# Altium footprint library Components.PcbLib: 139 footprints (part 9 of 9)
Each footprint in its own frame and in the unit in brackets; x right, y up, seen from the top. Pads: shape width x height; smd on the part's side, far side on the other; paste and mask are expansions set on the pad; w line width, h text height; cw(c..) or ccw(c..) is an arc to the next point about the centre after c.
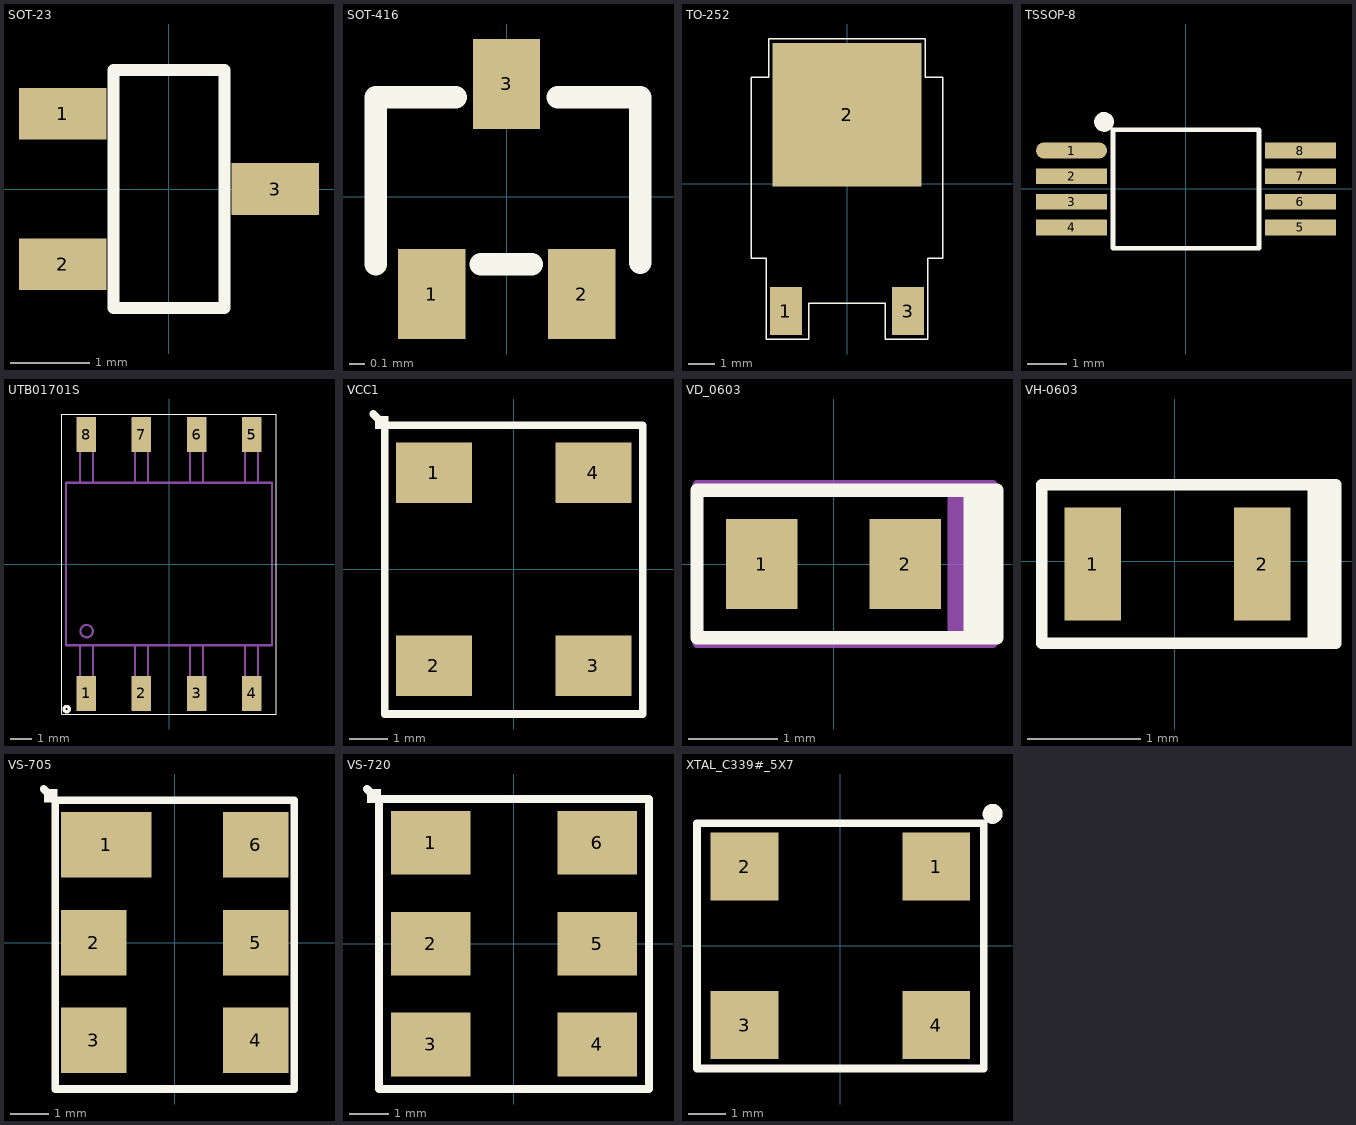
[diagram p8: the footprints below, top view; thin cyan lines are the x and y axes]

## SOT-23 [mm]
pads (3):
  rect 1.1x0.65 smd paste-0.05 mask+0.06: 1(-1.34,0.95) 2(-1.34,-0.95) 3(1.34,0)
Top Overlay:
  lines w0.15: -0.7,-1.5 -0.7,1.5 0.7,1.5 0.7,-1.5 -0.7,-1.5
3D body "SW3dPS-3-lead sot23-3.STEP": height 1.05, standoff 0.03, extent -1.276,-1.46 1.2,1.46

## SOT-416 [mm]
pads (3):
  rect 0.45x0.6 smd paste-0.04 mask+0.04: 1(-0.5,-0.65) 2(0.5,-0.65) 3(0,0.75)
Top Overlay:
  lines w0.15: -0.87,-0.45 -0.87,0.66 -0.34,0.66 ; -0.17,-0.45 0.17,-0.45 ; 0.34,0.66 0.89,0.66 0.89,-0.44
3D body "User Library-SOT-416.step": height 0.78, standoff -0.02, extent -0.79,-0.74 0.81,0.86

## TO-252 [mm]
pads (3):
  rect 1.2x1.8 smd paste-0.18 mask+0.05: 1(-2.3,-4.8) 3(2.3,-4.8)
  rect 5.6x5.4 smd paste-1 mask+0.1: 2(0,2.6)
Top Overlay:
  lines w0.05: -3.6,-2.8 -3.6,4 -2.95,4 -2.95,5.45 2.95,5.45 2.95,4 3.6,4 3.6,-2.8 3.05,-2.8 3.05,-5.85 1.45,-5.85 1.45,-4.5 -1.45,-4.5 -1.45,-5.85 -3.05,-5.85 -3.05,-2.8 -3.6,-2.8
3D body "User Library-DPAK-1.step": height 2.34, standoff -0.07, extent -3.24,-4.969 3.3,4.969

## TSSOP-8 [mm]
pads (8):
  oval 1.8x0.4 smd paste-0.04 mask+0.04: 1(-2.9,0.975)
  rect 1.8x0.4 smd paste-0.04 mask+0.04: 2(-2.9,0.325) 3(-2.9,-0.325) 4(-2.9,-0.975) 5(2.9,-0.975) 6(2.9,-0.325) 7(2.9,0.325) 8(2.9,0.975)
Top Overlay:
  circle w0.25: c-2.075,1.7 r0.125
  lines w0.12: -1.85,-1.5 1.85,-1.5 1.85,1.5 -1.85,1.5 -1.85,-1.5
3D body "SW3dPS-JEDEC MO-153 (TSSOP).STEP": height 1.2, standoff 0, extent -3.178,-1.5 3.278,1.5

## UTB01701S [mm]
pads (8):
  rect 0.9x1.6 smd paste-0.1 mask+0.05: 1(-3.81,-5.975) 2(-1.27,-5.975) 3(1.27,-5.975) 4(3.81,-5.975) 5(3.81,5.975) 6(1.27,5.975) 7(-1.27,5.975) 8(-3.81,5.975)
Top Overlay:
  circle w0.15: c-4.725,-6.7 r0.125
  lines w0.05: -4.95,-6.925 -4.95,6.925 4.95,6.925 4.95,-6.925 -4.95,-6.925
Mechanical 1:
  circle w0.1: c-3.8,-3.1 r0.285
  lines w0.1: -4.75,-3.75 4.75,-3.75 4.75,3.75 -4.75,3.75 -4.75,-3.75
  lines w0.102: -4.115,-3.759 -4.115,-6.477 -3.505,-6.477 -3.505,-3.759 ; -4.115,3.759 -4.115,6.477 -3.505,6.477 -3.505,3.759 ; -1.575,-3.759 -1.575,-6.477 -0.965,-6.477 -0.965,-3.759 ; -1.575,3.759 -1.575,6.477 -0.965,6.477 -0.965,3.759 ; 0.965,-3.759 0.965,-6.477 1.575,-6.477 1.575,-3.759 ; 0.965,3.759 0.965,6.477 1.575,6.477 1.575,3.759 ; 3.505,-3.759 3.505,-6.477 4.115,-6.477 4.115,-3.759 ; 3.505,3.759 3.505,6.477 4.115,6.477 4.115,3.759
  text "T1" at -0.3,0.306 h0.5
Mechanical 9:
  lines w0.05: -4.775,-3.775 4.775,-3.775 4.775,3.775 -4.775,3.775 -4.775,-3.775
3D body: height 2, standoff 0, extent -4.975,-6.95 4.975,6.95

## VCC1 [mm]
pads (4):
  rect 2x1.6 smd paste-0.18: 1(-2.1,2.54) 2(-2.1,-2.54) 3(2.1,-2.54) 4(2.1,2.54)
Top Overlay:
  rectangle: -3.65,3.69 -3.3,4.04
  lines w0.2: -3.7,4.09 -3.4,3.79 ; -3.4,3.79 -3.4,-3.81 3.4,-3.81 3.4,3.79 -3.4,3.79
3D body: height 0.1, standoff 0, extent -3.202,-3.442 3.202,3.442

## VD_0603 [mm] "Chip, 2-Leads, Body 1,6x0,8mm, IPC Medium Density"
height 0.5
pads (2):
  rect 0.8x1 smd paste-0.08 mask+0.05: 1(-0.8,0) 2(0.8,0)
Top Overlay:
  lines w0.15: 1.525,-0.825 1.525,0.825 ; 1.625,0.8 1.625,-0.725 1.725,-0.725 ; 1.725,-0.8 1.725,0.65 ; 1.725,0.725 1.8,0.725 ; -1.525,-0.825 -1.525,0.825 1.825,0.825 1.825,-0.825 -1.525,-0.825
Mechanical 29:
  rectangle: 1.27,-0.889 1.778,0.889
  lines w0.1: -1.524,-0.889 -1.524,0.889 1.778,0.889 1.778,-0.889 -1.524,-0.889
  text ".Designator" at -1.27,-0.254 h0.5
3D body: height 0.5, standoff 0, extent -0.85,-0.45 0.85,0.45

## VH-0603 [mm]
pads (2):
  rect 0.5x1 smd paste-0.05 mask+0.05: 1(-0.725,-0.025) 2(0.775,-0.025)
Top Overlay:
  lines w0.1: 1,0.675 1.425,0.675 1.425,-0.725 1.1,-0.725 ; 1.325,-0.725 1.325,0.675 ; -1.175,-0.725 -1.175,0.675 1.225,0.675 1.225,-0.725 -1.175,-0.725
3D body: height 0.56, standoff 0.55, extent -0.725,-0.575 -0.6,0.525
3D body: height 0.55, standoff 0.05, extent -0.85,-0.575 0.9,0.525

## VS-705 [mm]
pads (6):
  rect 2.35x1.7 smd paste-0.18: 1(-1.78,2.54)
  rect 1.7x1.7 smd paste-0.18: 2(-2.1,0) 3(-2.1,-2.54) 4(2.1,-2.54) 5(2.1,0) 6(2.1,2.54)
Top Overlay:
  rectangle: -3.4,3.64 -3.05,3.99
  lines w0.2: -3.4,3.99 -3.1,3.69 ; -3.1,-3.8 3.1,-3.8 3.1,3.7 -3.1,3.7 -3.1,-3.8
3D body "VC-706.STEP": height 1.6, standoff 0, extent -2.48,-3.55 2.52,3.45

## VS-720 [mm]
pads (6):
  rect 2x1.6 smd paste-0.18: 1(-2.1,2.54) 2(-2.1,0) 3(-2.1,-2.54) 4(2.1,-2.54) 5(2.1,0) 6(2.1,2.54)
Top Overlay:
  rectangle: -3.7,3.54 -3.35,3.89
  lines w0.2: -3.7,3.89 -3.4,3.59 ; -3.4,-3.66 3.4,-3.66 3.4,3.64 -3.4,3.64 -3.4,-3.66

## XTAL_C339#_5X7 [mm]
pads (4):
  rect 1.8x1.8 smd paste-0.18 mask+0.05: 1(2.54,2.1) 2(-2.54,2.1) 3(-2.54,-2.1) 4(2.54,-2.1)
Top Overlay:
  circle w0.3: c4.035,3.5 r0.115
  lines w0.2: -3.8,-3.25 3.8,-3.25 3.8,3.25 -3.8,3.25 -3.8,-3.25